# Altium footprint library Standard2.PcbLib: 423 footprints (part 18 of 27)
Each footprint in its own frame and in the unit in brackets; x right, y up, seen from the top. Pads: shape width x height; smd on the part's side, far side on the other; paste and mask are expansions set on the pad; w line width, h text height; cw(c..) or ccw(c..) is an arc to the next point about the centre after c.
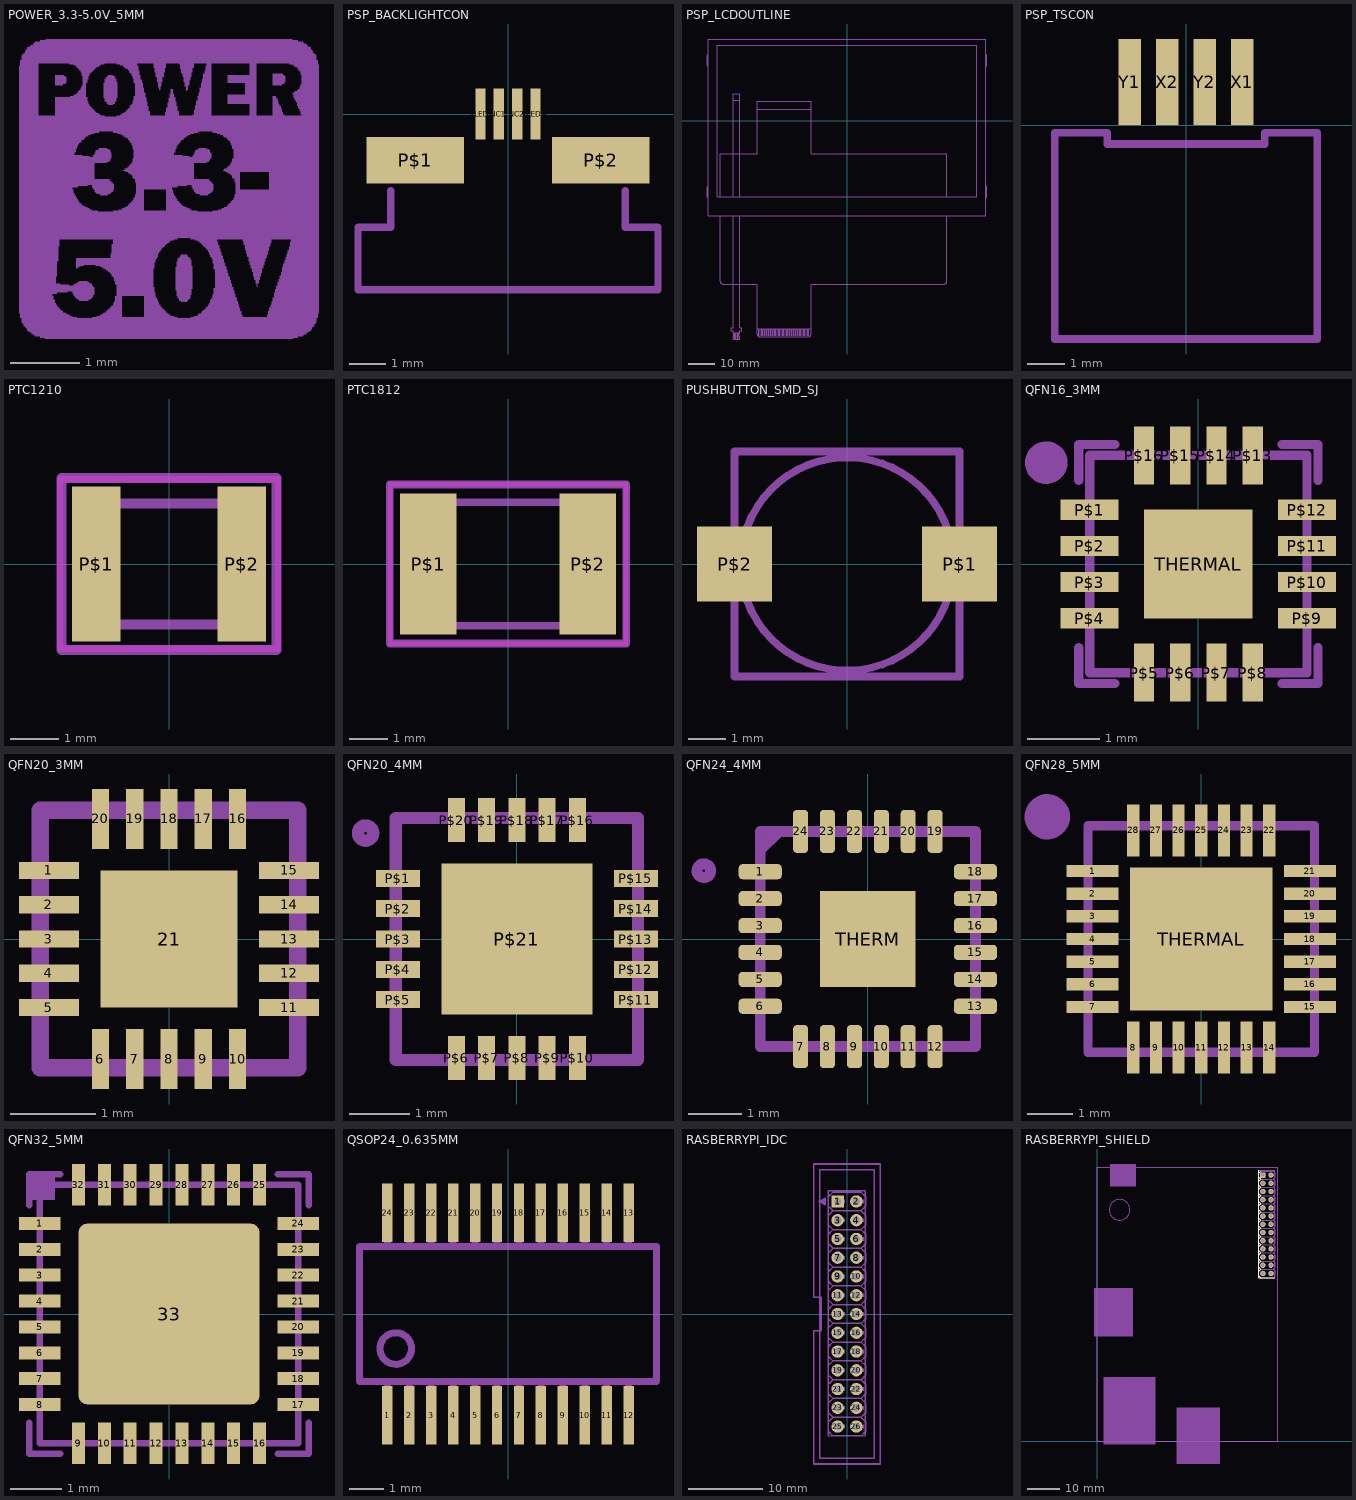
[diagram p17: the footprints below, top view; thin cyan lines are the x and y axes]

## POWER_3.3-5.0V_5MM [mm]
Mechanical 2:
  drawing of 1141 lines, arcs and shapes, not listed

## PSP_BACKLIGHTCON [mil]
pads (6):
  rect 11.02x55.12 smd: NC1(-9.84,0) NC2(9.84,0) VLED+(29.53,0) VLED-(-29.53,0)
  rect 105x50 smd: P$1(-100,-50) P$2(100,-50)
Mechanical 2:
  lines w8: -125.98,-82.68 -125.98,-122.05 -161.42,-122.05 -161.42,-188.98 161.42,-188.98 161.42,-122.05 125.98,-122.05 125.98,-82.68

## PSP_LCDOUTLINE [mm]
Mechanical 2:
  lines w0.203: -52.75,-36.05 52.75,-36.05 52.75,31.15 -52.75,31.15 -52.75,-36.05
Mechanical 18:
  drawing of 175 lines, arcs and shapes, not listed

## PSP_TSCON [mm]
pads (4):
  rect 0.6x2.3 smd: X1(1.5,1.15) X2(-0.5,1.15) Y1(-1.5,1.15) Y2(0.5,1.15)
Mechanical 2:
  lines w0.203: -3.5,-5.7 3.5,-5.7 3.5,-0.2 2.1,-0.2 2.1,-0.5 -2.1,-0.5 -2.1,-0.2 -3.5,-0.2 -3.5,-5.7

## PTC1210 [mm]
pads (2):
  rect 1x3.2 smd: P$1(-1.5,0) P$2(1.5,0)
Keep-Out Layer:
  lines w0.127: -2.25,-1.75 -2.25,1.75 2.25,1.75 2.25,-1.75 -2.25,-1.75
Mechanical 2:
  lines w0.203: -2.222,-1.778 -2.222,1.778 2.222,1.778 2.222,-1.778 -2.222,-1.778
Mechanical 18:
  lines w0.203: -1.6,-1.25 -1.6,-0.25 ccw(c-1.6,0) -1.6,0.25 -1.6,1.25 1.6,1.25 1.6,0.25 ccw(c1.6,0) 1.6,-0.25 1.6,-1.25 -1.6,-1.25

## PTC1812 [mm]
pads (2):
  rect 1.5x3.7 smd: P$1(-2.1,0) P$2(2.1,0)
Keep-Out Layer:
  lines w0.127: -3.1,-2.1 3.1,-2.1 3.1,2.1 -3.1,2.1 -3.1,-2.1
Mechanical 2:
  lines w0.203: -3.111,-2.095 3.111,-2.095 3.111,2.095 -3.111,2.095 -3.111,-2.095
Mechanical 18:
  lines w0.127: -2.25,-0.5 ccw(c-2.25,0) -2.25,0.5 ; 2.25,-0.5 cw(c2.25,0) 2.25,0.5
  lines w0.203: -2.25,-0.5 -2.25,-1.625 2.25,-1.625 2.25,-0.5 ; -2.25,0.5 -2.25,1.625 2.25,1.625 2.25,0.5

## PUSHBUTTON_SMD_SJ [mm]
pads (2):
  rect 2x2 smd: P$1(3,0) P$2(-3,0)
Mechanical 2:
  lines w0.203: -3,-1.7 -3,-3 3,-3 3,-1.7 ; -3,1.7 -3,3 3,3 3,1.7
Mechanical 18:
  circle w0.203: c0,0 r2.84
  lines w0.127: -3,-3 3,-3 ; -3,3 3,3
  lines w0.203: -3,-3 -3,3 ; 3,-3 3,3

## QFN16_3MM [mil]
pads (17):
  rect 31.5x11.02 smd: P$1(-59.06,29.53) P$2(-59.06,9.84) P$3(-59.06,-9.84) P$4(-59.06,-29.53) P$9(59.06,-29.53) P$10(59.06,-9.84) P$11(59.06,9.84) P$12(59.06,29.53)
  rect 11.02x31.5 smd: P$5(-29.53,-59.06) P$6(-9.84,-59.06) P$7(9.84,-59.06) P$8(29.53,-59.06) P$13(29.53,59.06) P$14(9.84,59.06) P$15(-9.84,59.06) P$16(-29.53,59.06)
  rect 59.06x59.06 smd: THERMAL(0,0)
Mechanical 2:
  circle w12: c-82.68,55.12 r5.57
  lines w5: -64.96,-45.47 -64.96,-64.96 -45.47,-64.96 ; -64.96,45.47 -64.96,64.96 -45.47,64.96 ; 45.47,-64.96 64.96,-64.96 64.96,-45.47 ; 45.47,64.96 64.96,64.96 64.96,45.47
Mechanical 18:
  lines w5: -59.06,-59.06 59.06,-59.06 59.06,59.06 -59.06,59.06 -59.06,-59.06

## QFN20_3MM [mil]
pads (21):
  rect 27.56x7.87 smd: 1(-55.12,31.5) 2(-55.12,15.75) 3(-55.12,0) 4(-55.12,-15.75) 5(-55.12,-31.5) 11(55.12,-31.5) 12(55.12,-15.75) 13(55.12,0) 14(55.12,15.75) 15(55.12,31.5)
  rect 7.87x27.56 smd: 6(-31.5,-55.12) 7(-15.75,-55.12) 8(0,-55.12) 9(15.75,-55.12) 10(31.5,-55.12) 16(31.5,55.12) 17(15.75,55.12) 18(0,55.12) 19(-15.75,55.12) 20(-31.5,55.12)
  rect 62.99x62.99 smd: 21(0,0)
Mechanical 2:
  lines w8: -59.06,-43.31 -59.06,-59.06 -43.31,-59.06 ; -59.06,43.31 -59.06,59.06 -43.31,59.06 ; 43.31,-59.06 59.06,-59.06 59.06,-43.31 ; 43.31,59.06 59.06,59.06 59.06,43.31
Mechanical 18:
  lines w8: -59.06,-59.06 59.06,-59.06 59.06,59.06 -59.06,59.06 -59.06,-59.06

## QFN20_4MM [mm]
pads (21):
  rect 0.73x0.28 smd: P$1(-1.965,1) P$2(-1.965,0.5) P$3(-1.965,0) P$4(-1.965,-0.5) P$5(-1.965,-1) P$11(1.965,-1) P$12(1.965,-0.5) P$13(1.965,0) P$14(1.965,0.5) P$15(1.965,1)
  rect 0.28x0.73 smd: P$6(-1,-1.965) P$7(-0.5,-1.965) P$8(0,-1.965) P$9(0.5,-1.965) P$10(1,-1.965) P$16(1,1.965) P$17(0.5,1.965) P$18(0,1.965) P$19(-0.5,1.965) P$20(-1,1.965)
  rect 2.5x2.5 smd paste-1.25: P$21(0,0)
Top Paste:
  rectangle: -1,0.25 -0.25,1
  rectangle: 0.25,0.25 1,1
  rectangle: -1,-1 -0.25,-0.25
  rectangle: 0.25,-1 1,-0.25
Mechanical 2:
  circle w0.203: c-2.5,1.75 r0.125
  lines w0.203: -2,-1.5 -2,-2 -1.5,-2 ; -2,1.5 -2,2 -1.5,2 ; 1.5,-2 2,-2 2,-1.5 ; 1.5,2 2,2 2,1.5
Mechanical 18:
  lines w0.203: -2,-2 2,-2 2,2 -2,2 -2,-2

## QFN24_4MM [mil]
pads (25):
  rrect50% 31.5x11.02 smd: 1(-78.74,49.21) 2(-78.74,29.53) 3(-78.74,9.84) 4(-78.74,-9.84) 5(-78.74,-29.53) 6(-78.74,-49.21) 13(78.74,-49.21) 14(78.74,-29.53) 15(78.74,-9.84) 16(78.74,9.84) 17(78.74,29.53) 18(78.74,49.21)
  rrect50% 11.02x31.5 smd: 7(-49.21,-78.74) 8(-29.53,-78.74) 9(-9.84,-78.74) 10(9.84,-78.74) 11(29.53,-78.74) 12(49.21,-78.74) 19(49.21,78.74) 20(29.53,78.74) 21(9.84,78.74) 22(-9.84,78.74) 23(-29.53,78.74) 24(-49.21,78.74)
  rect 70x70 smd paste-35: THERM(0,0)
Top Paste:
  rectangle: 3.94,3.94 29.53,29.53
  rectangle: 3.94,-29.53 29.53,-3.94
  rectangle: -29.53,3.94 -3.94,29.53
  rectangle: -29.53,-29.53 -3.94,-3.94
Mechanical 2:
  circle w8: c-120,50 r5
  lines w8: -78.74,-64.96 -78.74,-78.74 -64.96,-78.74 ; -78.74,64.96 -64.96,78.74 ; 64.96,-78.74 78.74,-78.74 78.74,-64.96 ; 64.96,78.74 78.74,78.74 78.74,64.96
Mechanical 18:
  lines w8: -78.74,-78.74 -78.74,78.74 78.74,78.74 78.74,-78.74 -78.74,-78.74

## QFN28_5MM [mm]
pads (29):
  rect 1.15x0.27 smd: 1(-2.4,1.5) 2(-2.4,1) 3(-2.4,0.5) 4(-2.4,0) 5(-2.4,-0.5) 6(-2.4,-1) 7(-2.4,-1.5) 15(2.4,-1.5) 16(2.4,-1) 17(2.4,-0.5) 18(2.4,0) 19(2.4,0.5) 20(2.4,1) 21(2.4,1.5)
  rect 0.27x1.15 smd: 8(-1.5,-2.4) 9(-1,-2.4) 10(-0.5,-2.4) 11(0,-2.4) 12(0.5,-2.4) 13(1,-2.4) 14(1.5,-2.4) 22(1.5,2.4) 23(1,2.4) 24(0.5,2.4) 25(0,2.4) 26(-0.5,2.4) 27(-1,2.4) 28(-1.5,2.4)
  rect 3.15x3.15 smd paste-1.575: THERMAL(0,0)
Top Paste:
  rectangle: 0.254,-1.27 1.27,-0.254
  rectangle: 0.254,0.254 1.27,1.27
  rectangle: -1.27,-1.27 -0.254,-0.254
  rectangle: -1.27,0.254 -0.254,1.27
Mechanical 2:
  circle w0.5: c-3.4,2.7 r0.25
  lines w0.203: -2.5,-2 -2.5,-2.5 -2,-2.5 ; -2.5,2 -2.5,2.5 -2,2.5 ; 2,-2.5 2.5,-2.5 2.5,-2 ; 2,2.5 2.5,2.5 2.5,2
Mechanical 18:
  lines w0.203: -2.5,-2.5 -2.5,2.5 2.5,2.5 2.5,-2.5 -2.5,-2.5

## QFN32_5MM [mil]
pads (33):
  rect 31.5x9.84 smd: 1(-98.43,68.9) 2(-98.43,49.21) 3(-98.43,29.53) 4(-98.43,9.84) 5(-98.43,-9.84) 6(-98.43,-29.53) 7(-98.43,-49.21) 8(-98.43,-68.9) 17(98.43,-68.9) 18(98.43,-49.21) 19(98.43,-29.53) 20(98.43,-9.84) 21(98.43,9.84) 22(98.43,29.53) 23(98.43,49.21) 24(98.43,68.9)
  rect 9.84x31.5 smd: 9(-68.9,-98.43) 10(-49.21,-98.43) 11(-29.53,-98.43) 12(-9.84,-98.43) 13(9.84,-98.43) 14(29.53,-98.43) 15(49.21,-98.43) 16(68.9,-98.43) 25(68.9,98.43) 26(49.21,98.43) 27(29.53,98.43) 28(9.84,98.43) 29(-9.84,98.43) 30(-29.53,98.43) 31(-49.21,98.43) 32(-68.9,98.43)
  rrect10% 137.8x137.8 smd paste-68.9: 33(0,0)
Top Paste:
  rectangle: -59.06,4.92 -4.92,59.06
  rectangle: 4.92,4.92 59.06,59.06
  rectangle: -59.06,-59.06 -4.92,-4.92
  rectangle: 4.92,-59.06 59.06,-4.92
Mechanical 2:
  rectangle: -106.3,86.61 -86.61,106.3
  lines w5: -106.3,-82.68 -106.3,-106.3 -82.68,-106.3 ; -106.3,82.68 -106.3,106.3 -82.68,106.3 ; 82.68,-106.3 106.3,-106.3 106.3,-82.68 ; 82.68,106.3 106.3,106.3 106.3,82.68
Mechanical 18:
  lines w5: -98.43,-98.43 98.43,-98.43 98.43,98.43 -98.43,98.43 -98.43,-98.43

## QSOP24_0.635MM [mil]
pads (24):
  rect 11.81x66.93 smd: 1(-137.5,-115.55) 2(-112.5,-115.55) 3(-87.5,-115.55) 4(-62.5,-115.55) 5(-37.5,-115.55) 6(-12.5,-115.55) 7(12.5,-115.55) 8(37.5,-115.55) 9(62.5,-115.55) 10(87.5,-115.55) 11(112.5,-115.55) 12(137.5,-115.55) 13(137.5,115.55) 14(112.5,115.55) 15(87.5,115.55) 16(62.5,115.55) 17(37.5,115.55) 18(12.5,115.55) 19(-12.5,115.55) 20(-37.5,115.55) 21(-62.5,115.55) 22(-87.5,115.55) 23(-112.5,115.55) 24(-137.5,115.55)
Mechanical 2:
  circle w8: c-127.95,-39.37 r18
  lines w8: -169.29,-76.77 -169.29,76.77 ; 169.29,-76.77 169.29,76.77
Mechanical 18:
  rectangle: -141.5,-109.77 -133.5,-76.77
  rectangle: 133.5,76.77 141.5,109.77
  rectangle: -116.5,-109.77 -108.5,-76.77
  rectangle: -91.5,-109.77 -83.5,-76.77
  rectangle: -66.5,-109.77 -58.5,-76.77
  rectangle: -41.5,-109.77 -33.5,-76.77
  rectangle: -16.5,-109.77 -8.5,-76.77
  rectangle: 8.5,-109.77 16.5,-76.77
  rectangle: 33.5,-109.77 41.5,-76.77
  rectangle: 58.5,-109.77 66.5,-76.77
  rectangle: 83.5,-109.77 91.5,-76.77
  rectangle: 108.5,-109.77 116.5,-76.77
  rectangle: 133.5,-109.77 141.5,-76.77
  rectangle: 108.5,76.77 116.5,109.77
  rectangle: 83.5,76.77 91.5,109.77
  rectangle: 58.5,76.77 66.5,109.77
  rectangle: 33.5,76.77 41.5,109.77
  rectangle: 8.5,76.77 16.5,109.77
  rectangle: -16.5,76.77 -8.5,109.77
  rectangle: -41.5,76.77 -33.5,109.77
  rectangle: -66.5,76.77 -58.5,109.77
  rectangle: -91.5,76.77 -83.5,109.77
  rectangle: -116.5,76.77 -108.5,109.77
  rectangle: -141.5,76.77 -133.5,109.77
  lines w8: -169.29,-76.77 169.29,-76.77 169.29,76.77 -169.29,76.77 -169.29,-76.77

## RASBERRYPI_IDC [mil]
pads (26):
  rect 66x66 hole 39.37: 1(-50,600)
  round 66 hole 39.37: 2(50,600) 3(-50,500) 4(50,500) 5(-50,400) 6(50,400) 7(-50,300) 8(50,300) 9(-50,200) 10(50,200) 11(-50,100) 12(50,100) 13(-50,0) 14(50,0) 15(-50,-100) 16(50,-100) 17(-50,-200) 18(50,-200) 19(-50,-300) 20(50,-300) 21(-50,-400) 22(50,-400) 23(-50,-500) 24(50,-500) 25(-50,-600) 26(50,-600)
Mechanical 2:
  region: -134,610 -134,590 -124,590 -124,610
  region: -124,615 -124,600 -119,600 -119,615
  region: -124,600 -124,585 -119,585 -119,600
  region: -142,605 -142,595 -132,595 -132,605
  lines w8: -140,600 -150,600 ; -150,600 -117,583 -117,617 -150,600 ; -75,-550 -100,-575 -100,-625 -75,-650 75,-650 100,-625 100,-575 75,-550 ; -75,-550 -100,-525 -100,-475 -75,-450 ; -75,-550 75,-550 ; -75,-450 -100,-425 -100,-375 -75,-350 ; -75,-450 75,-450 ; -75,-350 -100,-325 -100,-275 -75,-250 ; -75,-350 75,-350 ; -75,-250 -100,-225 -100,-175 -75,-150 ; -75,-250 75,-250 ; -75,-150 -100,-125 -100,-75 -75,-50 ; -75,-150 75,-150 ; -75,-50 -100,-25 -100,25 -75,50 ; -75,-50 75,-50 ; -75,50 -100,75 -100,125 -75,150 ; -75,50 75,50 ; -75,150 -100,175 -100,225 -75,250 ; -75,150 75,150 ; -75,250 -100,275 -100,325 -75,350 ; -75,250 75,250 ; -75,350 -100,375 -100,425 -75,450 ; -75,350 75,350 ; -75,450 -100,475 -100,525 -75,550 ; -75,450 75,450 ; -75,550 -100,575 -100,625 -75,650 75,650 100,625 100,575 75,550 ; -75,550 75,550 ; 75,-550 100,-525 100,-475 75,-450 ; 75,-450 100,-425 100,-375 75,-350 ; 75,-350 100,-325 100,-275 75,-250 ; 75,-250 100,-225 100,-175 75,-150 ; 75,-150 100,-125 100,-75 75,-50 ; 75,-50 100,-25 100,25 75,50 ; 75,50 100,75 100,125 75,150 ; 75,150 100,175 100,225 75,250 ; 75,250 100,275 100,325 75,350 ; 75,350 100,375 100,425 75,450 ; 75,450 100,475 100,525 75,550 ; -177.17,-799.61 177.17,-799.61 177.17,799.61 -177.17,799.61 -177.17,88.58 -137.8,88.58 -137.8,-88.58 -177.17,-88.58 -177.17,-799.61
Mechanical 18:
  region: -30,610 -30,590 -10,590 -10,610
  region: 70,610 70,590 90,590 90,610
  region: 70,510 70,490 90,490 90,510
  region: -30,510 -30,490 -10,490 -10,510
  region: 70,410 70,390 90,390 90,410
  region: -30,410 -30,390 -10,390 -10,410
  region: 70,310 70,290 90,290 90,310
  region: 70,210 70,190 90,190 90,210
  region: 70,110 70,90 90,90 90,110
  region: -30,310 -30,290 -10,290 -10,310
  region: -30,210 -30,190 -10,190 -10,210
  region: -30,110 -30,90 -10,90 -10,110
  region: 70,10 70,-10 90,-10 90,10
  region: -30,10 -30,-10 -10,-10 -10,10
  region: 70,-90 70,-110 90,-110 90,-90
  region: -30,-90 -30,-110 -10,-110 -10,-90
  region: 70,-190 70,-210 90,-210 90,-190
  region: -30,-190 -30,-210 -10,-210 -10,-190
  region: 70,-290 70,-310 90,-310 90,-290
  region: -30,-290 -30,-310 -10,-310 -10,-290
  region: 70,-390 70,-410 90,-410 90,-390
  region: -30,-390 -30,-410 -10,-410 -10,-390
  region: 70,-490 70,-510 90,-510 90,-490
  region: -30,-490 -30,-510 -10,-510 -10,-490
  region: 70,-590 70,-610 90,-610 90,-590
  region: -30,-590 -30,-610 -10,-610 -10,-590
  lines w5: -99.92,-650 96.93,-650
  lines w8: -99.92,-650 -99.92,657.09 96.93,657.09 96.93,-650 ; -145.67,-768.11 -145.67,768.11 145.67,768.11 145.67,-768.11 -145.67,-768.11

## RASBERRYPI_SHIELD [mil]
pads (26):
  rect 66x66 hole 39.37: 1(2020,3250)
  round 66 hole 39.37: 2(2120,3250) 3(2020,3150) 4(2120,3150) 5(2020,3050) 6(2120,3050) 7(2020,2950) 8(2120,2950) 9(2020,2850) 10(2120,2850) 11(2020,2750) 12(2120,2750) 13(2020,2650) 14(2120,2650) 15(2020,2550) 16(2120,2550) 17(2020,2450) 18(2120,2450) 19(2020,2350) 20(2120,2350) 21(2020,2250) 22(2120,2250) 23(2020,2150) 24(2120,2150) 25(2020,2050) 26(2120,2050)
Top Overlay:
  lines w5: 1970.08,3307.09 1970.08,2000 2166.93,2000
  lines w6: 1995,2000 1970,2025 1970,2075 1995,2100 1970,2125 1970,2175 1995,2200 1970,2225 1970,2275 1995,2300 1970,2325 1970,2375 1995,2400 1970,2425 1970,2475 1995,2500 1970,2525 1970,2575 1995,2600 1970,2625 1970,2675 1995,2700 1970,2725 1970,2775 1995,2800 1970,2825 1970,2875 1995,2900 1970,2925 1970,2975 1995,3000 1970,3025 1970,3075 1995,3100 1970,3125 1970,3175 1995,3200 1970,3225 1970,3275 1995,3300
Mechanical 1:
  lines w5: 0,0 0,3346.46 2204.72,3346.46 2204.72,0 0,0
Mechanical 2:
  lines w8: 1995,2000 2145,2000 2170,2025 2170,2075 2145,2100 ; 1995,2100 2145,2100 ; 1995,2200 2145,2200 ; 1995,2300 2145,2300 ; 1995,2400 2145,2400 ; 1995,2500 2145,2500 ; 1995,2600 2145,2600 ; 1995,2700 2145,2700 ; 1995,2800 2145,2800 ; 1995,2900 2145,2900 ; 1995,3000 2145,3000 ; 1995,3100 2145,3100 ; 1995,3200 2145,3200 ; 1995,3300 2145,3300 2170,3275 2170,3225 2145,3200 ; 2145,2100 2170,2125 2170,2175 2145,2200 ; 2145,2200 2170,2225 2170,2275 2145,2300 ; 2145,2300 2170,2325 2170,2375 2145,2400 ; 2145,2400 2170,2425 2170,2475 2145,2500 ; 2145,2500 2170,2525 2170,2575 2145,2600 ; 2145,2600 2170,2625 2170,2675 2145,2700 ; 2145,2700 2170,2725 2170,2775 2145,2800 ; 2145,2800 2170,2825 2170,2875 2145,2900 ; 2145,2900 2170,2925 2170,2975 2145,3000 ; 2145,3000 2170,3025 2170,3075 2145,3100 ; 2145,3100 2170,3125 2170,3175 2145,3200
Mechanical 14:
  circle w5: c271.65,2826.77 r125.98
  rectangle: 78.74,-39.37 708.66,787.4
  rectangle: 964.57,-275.59 1496.06,413.39
  rectangle: 157.48,3110.24 472.44,3385.83
  rectangle: -39.37,1279.53 433.07,1870.08
  region: 0,0 10,0 10,10 0,10
  region: 0,0 10,0 10,10 0,10
Mechanical 18:
  region: 2040,3260 2040,3240 2060,3240 2060,3260
  region: 2140,3260 2140,3240 2160,3240 2160,3260
  region: 2140,3160 2140,3140 2160,3140 2160,3160
  region: 2040,3160 2040,3140 2060,3140 2060,3160
  region: 2140,3060 2140,3040 2160,3040 2160,3060
  region: 2040,3060 2040,3040 2060,3040 2060,3060
  region: 2140,2960 2140,2940 2160,2940 2160,2960
  region: 2140,2860 2140,2840 2160,2840 2160,2860
  region: 2140,2760 2140,2740 2160,2740 2160,2760
  region: 2040,2960 2040,2940 2060,2940 2060,2960
  region: 2040,2860 2040,2840 2060,2840 2060,2860
  region: 2040,2760 2040,2740 2060,2740 2060,2760
  region: 2140,2660 2140,2640 2160,2640 2160,2660
  region: 2040,2660 2040,2640 2060,2640 2060,2660
  region: 2140,2560 2140,2540 2160,2540 2160,2560
  region: 2040,2560 2040,2540 2060,2540 2060,2560
  region: 2140,2460 2140,2440 2160,2440 2160,2460
  region: 2040,2460 2040,2440 2060,2440 2060,2460
  region: 2140,2360 2140,2340 2160,2340 2160,2360
  region: 2040,2360 2040,2340 2060,2340 2060,2360
  region: 2140,2260 2140,2240 2160,2240 2160,2260
  region: 2040,2260 2040,2240 2060,2240 2060,2260
  region: 2140,2160 2140,2140 2160,2140 2160,2160
  region: 2040,2160 2040,2140 2060,2140 2060,2160
  region: 2140,2060 2140,2040 2160,2040 2160,2060
  region: 2040,2060 2040,2040 2060,2040 2060,2060
  lines w8: 1970.08,3307.09 2166.93,3307.09 2166.93,2000